# Altium footprint library PERCRO_footprints.PcbLib: 177 footprints (part 7 of 12)
Each footprint in its own frame and in the unit in brackets; x right, y up, seen from the top. Pads: shape width x height; smd on the part's side, far side on the other; paste and mask are expansions set on the pad; w line width, h text height; cw(c..) or ccw(c..) is an arc to the next point about the centre after c.
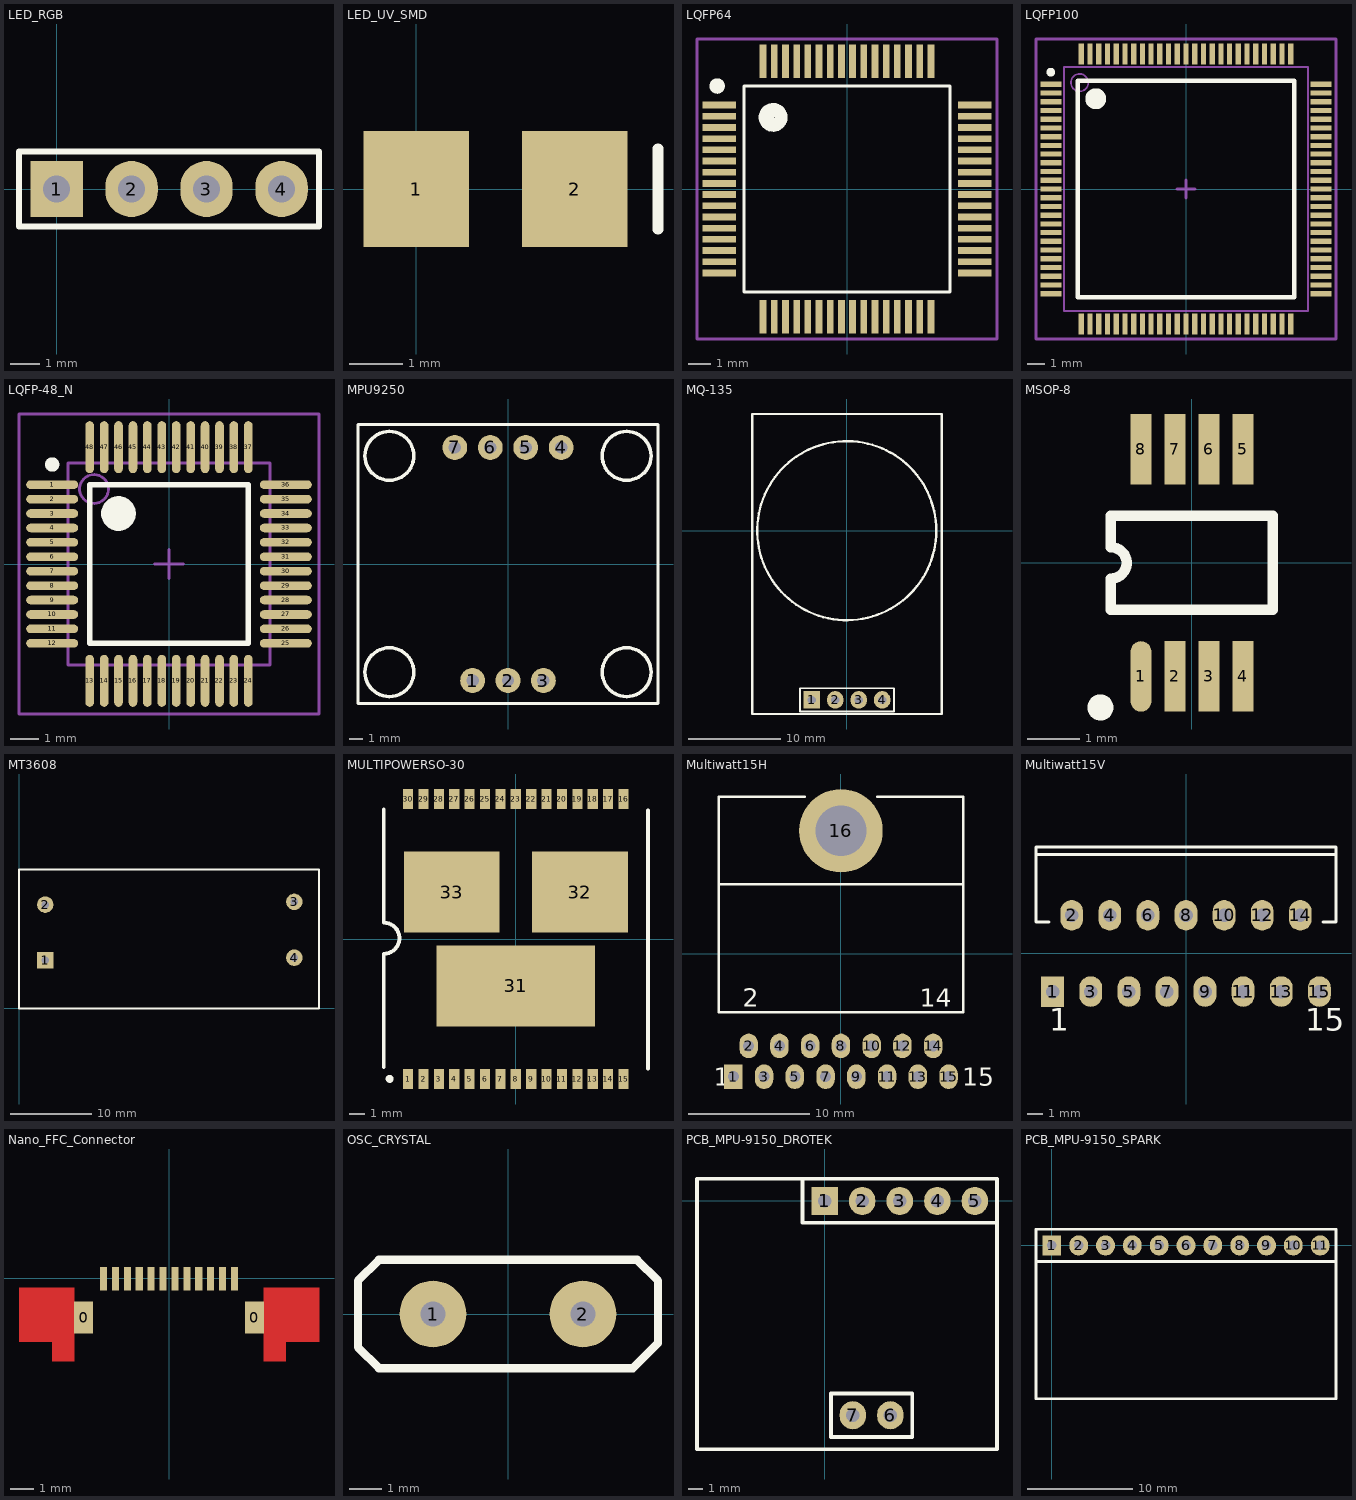
[diagram p6: the footprints below, top view; thin cyan lines are the x and y axes]

## LED_RGB [mil] "LED_RGB_COMMON_CATHODE"
pads (4):
  rect 70x75 hole 35.43: 1(0,0)
  oval 70x75 hole 35.43: 2(100,0) 3(200,0) 4(300,0)
Top Overlay:
  lines w7.87: -50,-50 350,-50 350,50 -50,50 -50,-50

## LED_UV_SMD [mm]
pads (2):
  rect 2x2.2 smd: 1(0,0) 2(3,0)
Top Overlay:
  lines w0.203: 4.572,-0.762 4.572,0.762

## LQFP64 [mm] "10mm x 10 mm, 0.5 pitch"
pads (64):
  rect 1.5x0.3 smd: 1(-5.7,3.75) 2(-5.7,3.25) 3(-5.7,2.75) 4(-5.7,2.25) 5(-5.7,1.75) 6(-5.7,1.25) 7(-5.7,0.75) 8(-5.7,0.25) 9(-5.7,-0.25) 10(-5.7,-0.75) 11(-5.7,-1.25) 12(-5.7,-1.75) 13(-5.7,-2.25) 14(-5.7,-2.75) 15(-5.7,-3.25) 16(-5.7,-3.75) 33(5.7,-3.75) 34(5.7,-3.25) 35(5.7,-2.75) 36(5.7,-2.25) 37(5.7,-1.75) 38(5.7,-1.25) 39(5.7,-0.75) 40(5.7,-0.25) 41(5.7,0.25) 42(5.7,0.75) 43(5.7,1.25) 44(5.7,1.75) 45(5.7,2.25) 46(5.7,2.75) 47(5.7,3.25) 48(5.7,3.75)
  rect 0.3x1.5 smd: 17(-3.75,-5.7) 18(-3.25,-5.7) 19(-2.75,-5.7) 20(-2.25,-5.7) 21(-1.75,-5.7) 22(-1.25,-5.7) 23(-0.75,-5.7) 24(-0.25,-5.7) 25(0.25,-5.7) 26(0.75,-5.7) 27(1.25,-5.7) 28(1.75,-5.7) 29(2.25,-5.7) 30(2.75,-5.7) 31(3.25,-5.7) 32(3.75,-5.7) 49(3.75,5.7) 50(3.25,5.7) 51(2.75,5.7) 52(2.25,5.7) 53(1.75,5.7) 54(1.25,5.7) 55(0.75,5.7) 56(0.25,5.7) 57(-0.25,5.7) 58(-0.75,5.7) 59(-1.25,5.7) 60(-1.75,5.7) 61(-2.25,5.7) 62(-2.75,5.7) 63(-3.25,5.7) 64(-3.75,5.7)
Top Overlay:
  circle w0.127: c-3.3,3.2 r0.583
  circle w0.127: c-3.3,3.2 r0.566
  circle w0.127: c-3.3,3.2 r0.5
  circle w0.127: c-3.3,3.2 r0.424
  circle w0.127: c-3.3,3.2 r0.283
  circle w0.127: c-3.3,3.2 r0.361
  circle w0.127: c-3.3,3.2 r0.141
  circle w0.127: c-3.3,3.2 r0.224
  circle w0.127: c-3.4,3.2 r0.1
  circle w0.127: c-5.8,4.6 r0.283
  circle w0.127: c-5.8,4.6 r0.224
  circle w0.127: c-5.8,4.6 r0.141
  circle w0.127: c-5.8,4.6 r0.1
  circle w0.127: c-5.8,4.6 r0.141
  circle w0.127: c-5.9,4.6 r0.1
  lines w0.127: -4.6,-4.6 4.6,-4.6 4.6,4.6 -4.6,4.6 -4.6,-4.6
Mechanical 1:
  lines w0.127: -6.7,-6.7 6.7,-6.7 6.7,6.7 -6.7,6.7 -6.7,-6.7
3D body "LQFP64_10mm_x_10mm.STEP": height 1.63, standoff 0, extent -6.072,-6.072 6.072,6.072

## LQFP100 [mm] "LQFP100 100-Leads, Body 14.00x14.00mm, Pitch 0.50mm, IPC Medium Density"
height 1.6
pads (100):
  rect 1.2x0.3 smd: 1(-7.75,6) 2(-7.75,5.5) 3(-7.75,5) 4(-7.75,4.5) 5(-7.75,4) 6(-7.75,3.5) 7(-7.75,3) 8(-7.75,2.5) 9(-7.75,2) 10(-7.75,1.5) 11(-7.75,1) 12(-7.75,0.5) 13(-7.75,0) 14(-7.75,-0.5) 15(-7.75,-1) 16(-7.75,-1.5) 17(-7.75,-2) 18(-7.75,-2.5) 19(-7.75,-3) 20(-7.75,-3.5) 21(-7.75,-4) 22(-7.75,-4.5) 23(-7.75,-5) 24(-7.75,-5.5) 25(-7.75,-6) 51(7.75,-6) 52(7.75,-5.5) 53(7.75,-5) 54(7.75,-4.5) 55(7.75,-4) 56(7.75,-3.5) 57(7.75,-3) 58(7.75,-2.5) 59(7.75,-2) 60(7.75,-1.5) 61(7.75,-1) 62(7.75,-0.5) 63(7.75,0) 64(7.75,0.5) 65(7.75,1) 66(7.75,1.5) 67(7.75,2) 68(7.75,2.5) 69(7.75,3) 70(7.75,3.5) 71(7.75,4) 72(7.75,4.5) 73(7.75,5) 74(7.75,5.5) 75(7.75,6)
  rect 0.3x1.2 smd: 26(-6,-7.75) 27(-5.5,-7.75) 28(-5,-7.75) 29(-4.5,-7.75) 30(-4,-7.75) 31(-3.5,-7.75) 32(-3,-7.75) 33(-2.5,-7.75) 34(-2,-7.75) 35(-1.5,-7.75) 36(-1,-7.75) 37(-0.5,-7.75) 38(0,-7.75) 39(0.5,-7.75) 40(1,-7.75) 41(1.5,-7.75) 42(2,-7.75) 43(2.5,-7.75) 44(3,-7.75) 45(3.5,-7.75) 46(4,-7.75) 47(4.5,-7.75) 48(5,-7.75) 49(5.5,-7.75) 50(6,-7.75) 76(6,7.75) 77(5.5,7.75) 78(5,7.75) 79(4.5,7.75) 80(4,7.75) 81(3.5,7.75) 82(3,7.75) 83(2.5,7.75) 84(2,7.75) 85(1.5,7.75) 86(1,7.75) 87(0.5,7.75) 88(0,7.75) 89(-0.5,7.75) 90(-1,7.75) 91(-1.5,7.75) 92(-2,7.75) 93(-2.5,7.75) 94(-3,7.75) 95(-3.5,7.75) 96(-4,7.75) 97(-4.5,7.75) 98(-5,7.75) 99(-5.5,7.75) 100(-6,7.75)
Top Overlay:
  circle w0.25: c-7.75,6.7 r0.125
  circle w0.6: c-5.173,5.173 r0.3
  lines w0.254: -6.2,-6.2 -6.2,6.2 6.2,6.2 6.2,-6.2 -6.2,-6.2
Mechanical 13:
  circle w0.1: c-6.1,6.1 r0.5
  lines w0.1: -7,-7 -7,7 7,7 7,-7 -7,-7
Mechanical 15:
  lines w0.2: -0.5,0 0.5,0 ; 0,-0.5 0,0.5 ; -8.6,-8.6 -8.6,8.6 8.6,8.6 8.6,-8.6 -8.6,-8.6
3D body "User Library-LQFP100.step": height 1.6, standoff 0, extent -8,-8 8,8

## LQFP-48_N [mm] "Thin QFP, 48-Leads, Body 7x7mm, Pitch 0.5mm, IPC Low Density"
height 1.6
pads (48):
  oval 1.8x0.3 smd: 1(-4.05,2.75) 2(-4.05,2.25) 3(-4.05,1.75) 4(-4.05,1.25) 5(-4.05,0.75) 6(-4.05,0.25) 7(-4.05,-0.25) 8(-4.05,-0.75) 9(-4.05,-1.25) 10(-4.05,-1.75) 11(-4.05,-2.25) 12(-4.05,-2.75) 25(4.05,-2.75) 26(4.05,-2.25) 27(4.05,-1.75) 28(4.05,-1.25) 29(4.05,-0.75) 30(4.05,-0.25) 31(4.05,0.25) 32(4.05,0.75) 33(4.05,1.25) 34(4.05,1.75) 35(4.05,2.25) 36(4.05,2.75)
  oval 0.3x1.8 smd: 13(-2.75,-4.05) 14(-2.25,-4.05) 15(-1.75,-4.05) 16(-1.25,-4.05) 17(-0.75,-4.05) 18(-0.25,-4.05) 19(0.25,-4.05) 20(0.75,-4.05) 21(1.25,-4.05) 22(1.75,-4.05) 23(2.25,-4.05) 24(2.75,-4.05) 37(2.75,4.05) 38(2.25,4.05) 39(1.75,4.05) 40(1.25,4.05) 41(0.75,4.05) 42(0.25,4.05) 43(-0.25,4.05) 44(-0.75,4.05) 45(-1.25,4.05) 46(-1.75,4.05) 47(-2.25,4.05) 48(-2.75,4.05)
Top Overlay:
  circle w0.6: c-1.75,1.75 r0.3
  circle w0.25: c-4.05,3.45 r0.125
  lines w0.2: -2.75,-2.75 2.75,-2.75 2.75,2.75 -2.75,2.75 -2.75,-2.75
Mechanical 13:
  circle w0.1: c-2.6,2.6 r0.5
  lines w0.1: -3.5,-3.5 3.5,-3.5 3.5,3.5 -3.5,3.5 -3.5,-3.5
Mechanical 15:
  lines w0.1: -0.5,0 0.5,0 ; 0,-0.5 0,0.5 ; -5.2,-5.2 5.2,-5.2 5.2,5.2 -5.2,5.2 -5.2,-5.2
3D body: height 1.6, standoff 0, extent -3.5,-3.5 3.5,3.5

## MPU9250 [mil] "IMU 9DOF"
pads (7):
  round 70 hole 35: 1(-100,-328.74) 2(0,-328.74) 3(100,-328.74) 4(150,328.74) 5(50,328.74) 6(-50,328.74) 7(-150,328.74)
Top Overlay:
  circle w10: c-334.65,305.12 r68.9
  circle w10: c334.65,305.12 r68.9
  circle w10: c334.65,-305.12 r68.9
  circle w10: c-334.65,-305.12 r68.9
  lines w8: -423.23,-393.7 -423.23,393.7 423.23,393.7 423.23,-393.7 -423.23,-393.7

## MQ-135 [mil] "Sensor_CO2"
pads (4):
  rect 70x75 hole 35.43: 1(-149,-722)
  oval 70x75 hole 35.43: 2(-49,-722) 3(51,-722) 4(151,-722)
Top Overlay:
  circle w10: c0,0 r381.89
  lines w7.87: -199,-772 -199,-672 201,-672 201,-772 -199,-772
  lines w10: -402.54,-782 -402.54,497.53 404.54,497.53 404.54,-782 -402.54,-782
3D body "Module_MQ-135_CO2_v3.STEP": height 826.77, standoff -177.17, extent -392.7,-779 394.7,480.84

## MSOP-8 [mm]
pads (8):
  oval 0.4x1.35 smd: 1(-0.975,-2.175)
  rect 0.4x1.35 smd: 2(-0.325,-2.175) 3(0.325,-2.175) 4(0.975,-2.175) 5(0.975,2.175) 6(0.325,2.175) 7(-0.325,2.175) 8(-0.975,2.175)
Top Overlay:
  circle w0.25: c-1.751,-2.769 r0.125
  lines w0.2: -1.55,-0.9 -1.55,-0.3 ccw(c-1.55,0) -1.55,0.3 -1.55,0.9 1.55,0.9 1.55,-0.9 -1.55,-0.9
3D body "MSOP-8.step": height 1.15, standoff 0, extent -1.5,-2.45 1.5,2.45

## MT3608 [mm] "Regulator step-up 6W"
pads (4):
  rect 2.032x2.032 hole 0.9: 1(3.25,5.97)
  round 2.032 hole 0.9: 2(3.25,12.84) 3(34.03,13.18) 4(34.03,6.28)
Top Overlay:
  lines w0.254: 0,0 37.08,0 37.08,17.18 0,17.18 0,0
3D body "Step_up_MT3608.STEP": height 6.43, standoff 0, extent 0,0 37.08,17.18

## MULTIPOWERSO-30 [mm] "H-Bridge"
pads (33):
  rect 0.66x1.3 smd: 1(-7,-9.1) 2(-6,-9.1) 3(-5,-9.1) 4(-4,-9.1) 5(-3,-9.1) 6(-2,-9.1) 7(-1,-9.1) 8(0,-9.1) 9(1,-9.1) 10(2,-9.1) 11(3,-9.1) 12(4,-9.1) 13(5,-9.1) 14(6,-9.1) 15(7,-9.1) 16(7,9.1) 17(6,9.1) 18(5,9.1) 19(4,9.1) 20(3,9.1) 21(2,9.1) 22(1,9.1) 23(0,9.1) 24(-1,9.1) 25(-2,9.1) 26(-3,9.1) 27(-4,9.1) 28(-5,9.1) 29(-6,9.1) 30(-7,9.1)
  rect 10.3x5.25 smd: 31(0,-3.05)
  rect 6.23x5.25 smd: 32(4.165,3.05) 33(-4.165,3.05)
Top Overlay:
  lines w0.254: -8.585,-8.331 -8.585,-0.965 ccw(c-8.585,0.051) -8.585,1.067 -8.585,8.433 ; -8.16,-9.212 cw(c-8.204,-9.093) -8.134,-9.199 ; 8.585,-8.407 8.585,8.357
3D body "SW3dPS-PowSO30-ST.STEP": height 2.32, standoff -0.15, extent -8.6,-9.5 8.6,9.5

## Multiwatt15H [mm] "TO, Thru-Hole, Horizontal, Heatsink Mounted; 15 Bent Staggered Leads; Pitch 1.27 mm"
height 5
pads (16):
  rect 1.524x2.032 hole 0.9: 1(-8.89,-10.155)
  oval 1.524x2.032 hole 0.9: 2(-7.62,-7.615) 3(-6.35,-10.155) 4(-5.08,-7.615) 5(-3.81,-10.155) 6(-2.54,-7.615) 7(-1.27,-10.155) 8(0,-7.615) 9(1.27,-10.155) 10(2.54,-7.615) 11(3.81,-10.155) 12(5.08,-7.615) 13(6.35,-10.155) 14(7.62,-7.615) 15(8.89,-10.155)
  round 6.9 hole 4.2: 16(0,10.155)
Top Overlay:
  lines w0.2: -10.1,5.755 10.1,5.755 ; -3,12.955 -10.1,12.955 -10.1,-4.845 10.1,-4.845 10.1,12.955 3,12.955
  text "1" at -10.515,-10.905 h1.5
  text "15" at 10.015,-10.905 h1.5
  text "14" at 6.495,-4.37 h1.5
  text "2" at -8.12,-4.37 h1.5
3D body "Multiwatt15H.step": height 5, standoff -1.5, extent -9.8,-10.415 9.8,13.185

## Multiwatt15V [mil] "TO, Thru-Hole, Vertical, Heatsink Mounted; 15 Bent Staggered Leads; Pitch 1.27 mm"
height 826.77
pads (15):
  rect 60x80 hole 35.43: 1(-350,-100)
  oval 60x80 hole 35.43: 2(-300,100) 3(-250,-100) 4(-200,100) 5(-150,-100) 6(-100,100) 7(-50,-100) 8(0,100) 9(50,-100) 10(100,100) 11(150,-100) 12(200,100) 13(250,-100) 14(300,100) 15(350,-100)
Top Overlay:
  lines w7.87: -393.7,259.45 393.7,259.45 ; -360,82.28 -393.7,82.28 -393.7,279.13 393.7,279.13 393.7,82.28 360,82.28
  text "15" at 312.6,-203.35 h59.06
  text "1" at -359.06,-203.35 h59.06
3D body "Multiwatt15V.step": height 821.1, standoff -56.85, extent -385.82,-110.23 385.84,279.14

## Nano_FFC_Connector [mm] "SMD Connector for DC motor ENX8"
pads (14):
  rect 0.8x1.34 smd: 0(-3.588,-1.651) 0(3.588,-1.651)
  rect 0.3x1 smd: 1(2.75,-0.025) 2(2.25,-0.025) 3(1.75,-0.025) 4(1.25,-0.025) 5(0.75,-0.025) 6(0.25,-0.025) 7(-0.25,-0.025) 8(-0.75,-0.025) 9(-1.25,-0.025) 10(-1.75,-0.025) 11(-2.25,-0.025) 12(-2.75,-0.025)
Top Layer:
  region: -3.969,-0.406 -3.969,-3.48 -4.909,-3.48 -4.909,-2.667 -6.299,-2.667 -6.299,-0.406
  region: 3.969,-0.406 3.969,-3.48 4.909,-3.48 4.909,-2.667 6.299,-2.667 6.299,-0.406
3D body "527451297.stp": height 2, standoff 0, extent -6.05,-6.284 6.05,0.116

## OSC_CRYSTAL [mil]
pads (2):
  round 80 hole 30: 1(-90,0) 2(90,0)
Top Overlay:
  lines w10: -180,-40 -180,40 -155,65 155,65 180,40 180,-15 180,-35 150,-65 -155,-65 -180,-40

## PCB_MPU-9150_DROTEK [mm] "Slot to MPU_9150_DROTEK"
pads (7):
  rect 1.778x1.905 hole 0.9: 1(0,0)
  oval 1.778x1.905 hole 0.9: 2(2.54,0) 3(5.08,0) 4(7.62,0) 5(10.16,0) 6(4.445,-14.5) 7(1.905,-14.5)
Top Overlay:
  lines w0.254: -1.5,1.476 -1.5,0 -1.5,-1.476 11.612,-1.476 ; 0.429,-15.976 0.429,-14.5 0.429,-13.024 ; 0.499,-15.976 4.445,-15.976 5.851,-15.976 ; 0.499,-13.024 4.445,-13.024 5.851,-13.024 ; 5.921,-15.976 5.921,-14.5 5.921,-13.024 ; -8.64,-16.8 -8.64,1.5 11.66,1.5 11.66,-16.8 -8.64,-16.8
3D body "female_header_a-bl254-eg-g05d.stp": height 8.5, standoff -3.2, extent -1.395,-1.25 11.555,1.25
3D body "female_header_a-bl254-eg-g02d.stp": height 8.5, standoff -3.2, extent 0.57,-15.75 5.9,-13.25

## PCB_MPU-9150_SPARK [mil] "Slot to PCB_MPU-9150 from Sparkfun"
pads (11):
  rect 70x75 hole 35.43: 1(0,0)
  oval 70x75 hole 35.43: 2(100,0) 3(200,0) 4(300,0) 5(400,0) 6(500,0) 7(600,0) 8(700,0) 9(800,0) 10(900,0) 11(1000,0)
Top Overlay:
  lines w10: -59.06,-60 1059.06,-60 ; -59.06,-570.87 1059.06,-570.87 1059.06,60 -59.06,60 -59.06,-570.87
3D body "female_header_a-bl254-eg-g11d.stp": height 334.65, standoff -125.98, extent -54.91,-49.2 1054.93,49.22